# Altium footprint library m-BLANC.PcbLib: 53 footprints (part 3 of 4)
Each footprint in its own frame and in the unit in brackets; x right, y up, seen from the top. Pads: shape width x height; smd on the part's side, far side on the other; paste and mask are expansions set on the pad; w line width, h text height; cw(c..) or ccw(c..) is an arc to the next point about the centre after c.
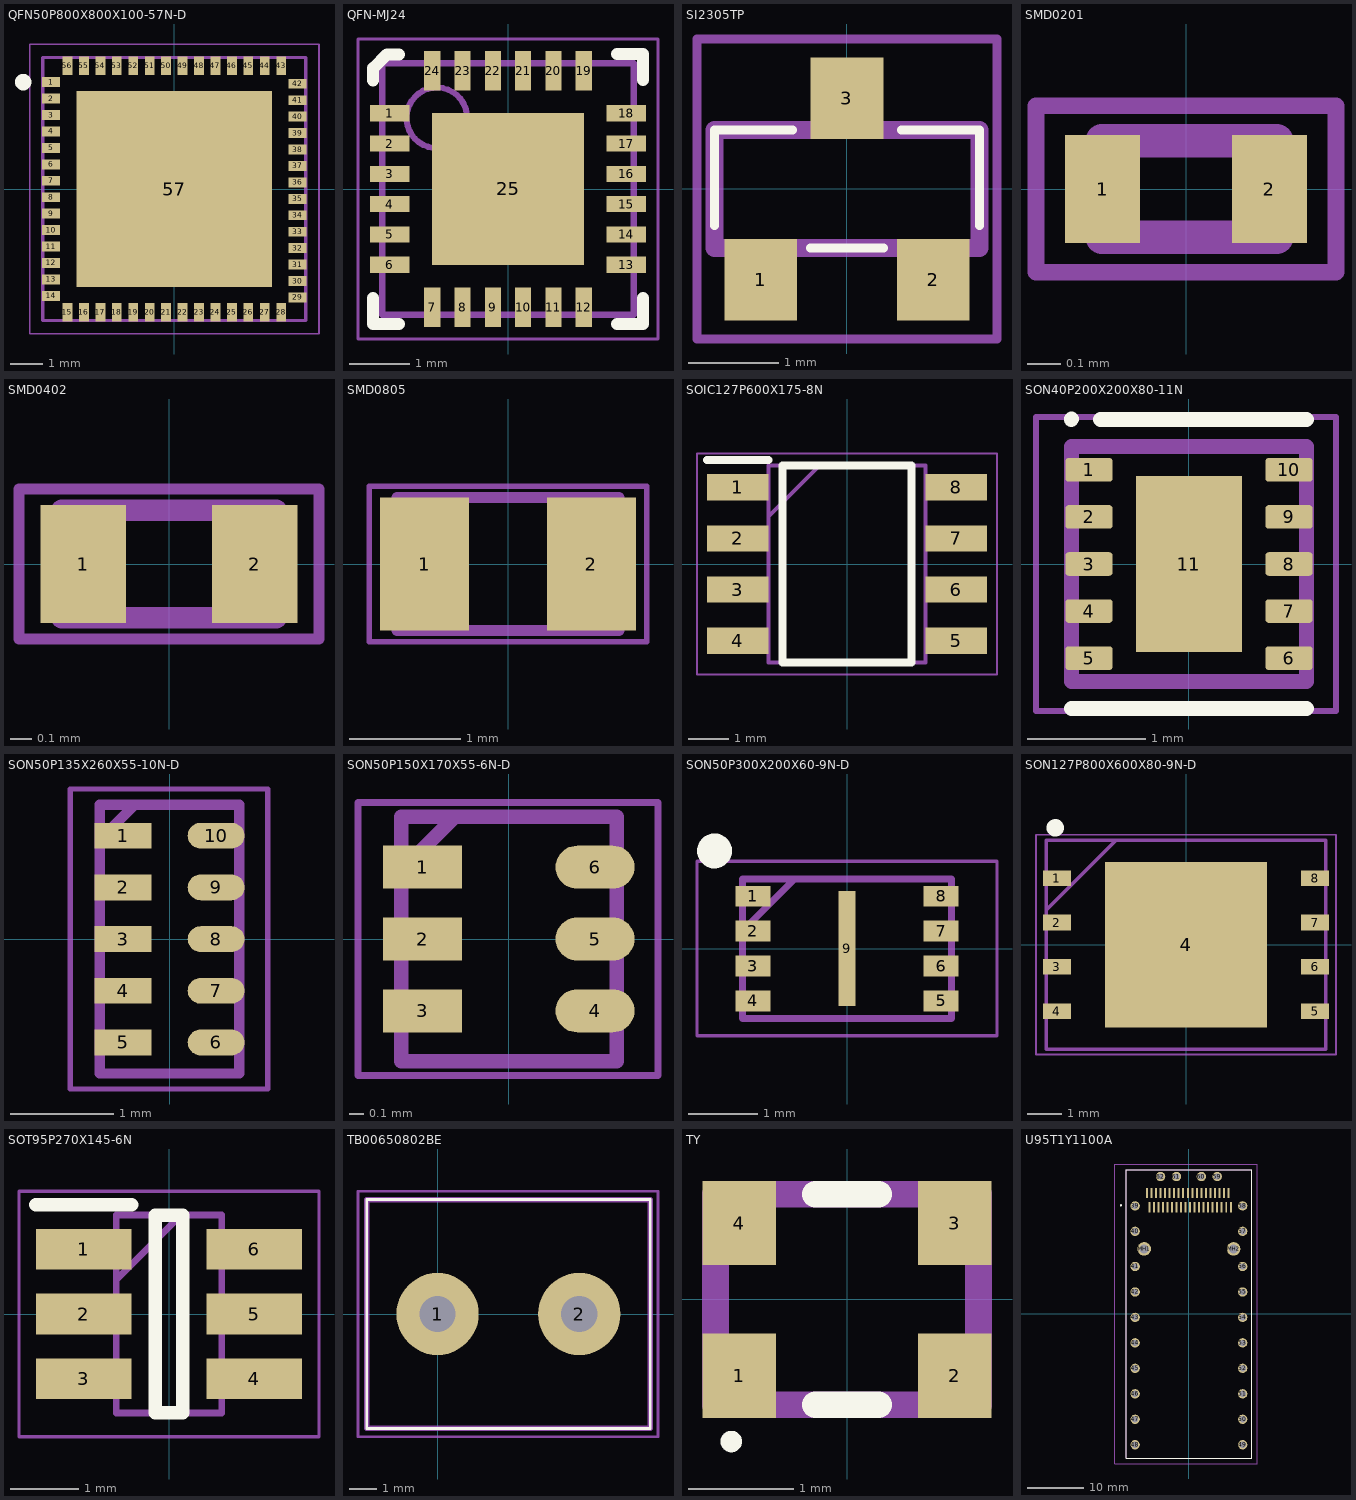
[diagram p2: the footprints below, top view; thin cyan lines are the x and y axes]

## QFN50P800X800X100-57N-D [mm]
pads (57):
  rect 0.55x0.3 smd: 1(-3.75,3.25) 2(-3.75,2.75) 3(-3.75,2.25) 4(-3.75,1.75) 5(-3.75,1.25) 6(-3.75,0.75) 7(-3.75,0.25) 8(-3.75,-0.25) 9(-3.75,-0.75) 10(-3.75,-1.25) 11(-3.75,-1.75) 12(-3.75,-2.25) 13(-3.75,-2.75) 14(-3.75,-3.25) 29(3.75,-3.3) 30(3.75,-2.8) 31(3.75,-2.3) 32(3.75,-1.8) 33(3.75,-1.3) 34(3.75,-0.8) 35(3.75,-0.3) 36(3.75,0.2) 37(3.75,0.7) 38(3.75,1.2) 39(3.75,1.7) 40(3.75,2.2) 41(3.75,2.7) 42(3.75,3.2)
  rect 0.3x0.55 smd: 15(-3.25,-3.75) 16(-2.75,-3.75) 17(-2.25,-3.75) 18(-1.75,-3.75) 19(-1.25,-3.75) 20(-0.75,-3.75) 21(-0.25,-3.75) 22(0.25,-3.75) 23(0.75,-3.75) 24(1.25,-3.75) 25(1.75,-3.75) 26(2.25,-3.75) 27(2.75,-3.75) 28(3.25,-3.75) 43(3.25,3.75) 44(2.75,3.75) 45(2.25,3.75) 46(1.75,3.75) 47(1.25,3.75) 48(0.75,3.75) 49(0.25,3.75) 50(-0.25,3.75) 51(-0.75,3.75) 52(-1.25,3.75) 53(-1.75,3.75) 54(-2.25,3.75) 55(-2.75,3.75) 56(-3.25,3.75)
  rect 5.95x5.95 smd: 57(0,0)
Top Overlay:
  circle w0.25: c-4.6,3.25 r0.125
Mechanical 13:
  lines w0.1: -4,-4 -4,4 4,4 4,-4 -4,-4
Mechanical 15:
  lines w0.05: -4.4,-4.4 -4.4,4.4 4.4,4.4 4.4,-4.4 -4.4,-4.4
3D body: height 0.8, standoff 0, extent -4,-4 4,4

## QFN-MJ24 [mm] "QFN, 24-Leads, Body 4x4mm, Pitch 0.5mm, Microchip Recommended"
height 0.9
pads (25):
  rect 0.65x0.265 smd: 1(-1.95,1.25) 2(-1.95,0.75) 3(-1.95,0.25) 4(-1.95,-0.25) 5(-1.95,-0.75) 6(-1.95,-1.25) 13(1.95,-1.25) 14(1.95,-0.75) 15(1.95,-0.25) 16(1.95,0.25) 17(1.95,0.75) 18(1.95,1.25)
  rect 0.265x0.65 smd: 7(-1.25,-1.95) 8(-0.75,-1.95) 9(-0.25,-1.95) 10(0.25,-1.95) 11(0.75,-1.95) 12(1.25,-1.95) 19(1.25,1.95) 20(0.75,1.95) 21(0.25,1.95) 22(-0.25,1.95) 23(-0.75,1.95) 24(-1.25,1.95)
  rect 2.5x2.5 smd paste-1.3: 25(0,0)
Top Overlay:
  lines w0.2: -2.225,-1.8 -2.225,-2.225 -1.8,-2.225 ; -2.225,1.793 -2.225,1.932 -2.225,1.995 -1.998,2.222 -1.8,2.222 ; 1.8,-2.225 2.225,-2.225 2.225,-1.8 ; 1.8,2.225 2.225,2.225 2.225,1.8
Top Paste:
  rectangle: 0.1,0.1 1.2,1.2
  region: -0.1,1.2 -1.2,1.2 -1.2,0.1 -0.1,0.1
  region: -0.1,-0.1 -1.2,-0.1 -1.2,-1.2 -0.1,-1.2
  rectangle: 0.1,-1.2 1.2,-0.1
Mechanical 13:
  circle w0.1: c-1.175,1.175 r0.5
  lines w0.1: -2.075,-2.075 2.075,-2.075 2.075,2.075 -2.075,2.075 -2.075,-2.075
Mechanical 15:
  lines w0.05: -2.475,-2.475 -2.475,2.475 2.475,2.475 2.475,-2.475 -2.475,-2.475
  lines w0.1: -0.5,0 0.5,0 ; 0,-0.5 0,0.5
3D body: height 0.9, standoff 0, extent -2.074,-2.074 2.074,2.074

## SI2305TP [mm]
pads (3):
  rect 0.8x0.9 smd: 1(-0.95,-1) 2(0.95,-1) 3(0,1)
Top Overlay:
  lines w0.1: -1.46,-0.4 -1.46,0.65 -0.6,0.65 ; -0.4,-0.65 0.4,-0.65 ; 0.6,0.65 1.46,0.65 1.46,-0.4
Mechanical 13:
  lines w0.2: -1.46,-0.65 -1.46,0.65 1.46,0.65 1.46,-0.65 -1.46,-0.65
Mechanical 15:
  lines w0.1: -1.651,-1.651 -1.651,1.651 1.651,1.651 1.651,-1.651 -1.651,-1.651

## SMD0201 [mm]
pads (2):
  rect 0.225x0.325 smd: 1(-0.25,0) 2(0.25,0)
Mechanical 13:
  lines w0.1: -0.252,-0.145 -0.252,0.145 0.272,0.145 0.272,-0.145 -0.252,-0.145
Mechanical 15:
  lines w0.05: -0.45,-0.25 -0.45,0.25 0.45,0.25 0.45,-0.25 -0.45,-0.25
3D body "CPF0201D100RE1.stp": height 0.28, standoff 0, extent -0.29,-0.145 0.29,0.145

## SMD0402 [mm]
pads (2):
  rect 0.4x0.55 smd: 1(-0.4,0) 2(0.4,0)
Mechanical 13:
  lines w0.1: -0.5,-0.25 0.5,-0.25 0.5,0.25 -0.5,0.25 -0.5,-0.25
Mechanical 15:
  lines w0.05: -0.7,-0.35 0.7,-0.35 0.7,0.35 -0.7,0.35 -0.7,-0.35
3D body "BLM15AX601SN1D.stp": height 0.55, standoff 0, extent -0.5,-0.25 0.5,0.25

## SMD0805 [mm]
pads (2):
  rect 0.8x1.2 smd: 1(-0.75,0) 2(0.75,0)
Mechanical 13:
  lines w0.1: -1,-0.6 1,-0.6 1,0.6 -1,0.6 -1,-0.6
Mechanical 15:
  lines w0.05: -1.25,-0.7 1.25,-0.7 1.25,0.7 -1.25,0.7 -1.25,-0.7
3D body "74479775147.stp": height 1, standoff 0, extent -1,-0.6 1,0.6

## SOIC127P600X175-8N [mm]
pads (8):
  rect 1.525x0.65 smd: 1(-2.712,1.905) 2(-2.712,0.635) 3(-2.712,-0.635) 4(-2.712,-1.905) 5(2.712,-1.905) 6(2.712,-0.635) 7(2.712,0.635) 8(2.712,1.905)
Top Overlay:
  lines w0.2: -3.475,2.58 -1.95,2.58 ; -1.6,-2.45 -1.6,2.45 1.6,2.45 1.6,-2.45 -1.6,-2.45
Mechanical 13:
  lines w0.1: -1.95,1.18 -0.68,2.45 ; -1.95,-2.45 -1.95,2.45 1.95,2.45 1.95,-2.45 -1.95,-2.45
Mechanical 15:
  lines w0.05: -3.725,-2.75 -3.725,2.75 3.725,2.75 3.725,-2.75 -3.725,-2.75
3D body "NE555DR.stp": height 1.75, standoff 0, extent -3,-2.45 3,2.45

## SON40P200X200X80-11N [mm]
pads (11):
  rrect25% 0.4x0.2 smd: 1(-0.85,0.8) 2(-0.85,0.4) 3(-0.85,0) 4(-0.85,-0.4) 5(-0.85,-0.8) 6(0.85,-0.8) 7(0.85,-0.4) 8(0.85,0) 9(0.85,0.4) 10(0.85,0.8)
  rect 0.9x1.5 smd paste-2: 11(0,0)
Top Overlay:
  lines w0.127: -1,1.23 -1,1.231 ; -1,-1.23 1,-1.23 ; -0.75,1.23 1,1.23
Mechanical 13:
  lines w0.127: -1,-1 -1,1 1,1 1,-1 -1,-1
Mechanical 15:
  lines w0.05: -1.3,-1.25 1.25,-1.25 1.25,1.25 -1.3,1.25 -1.3,-1.25
3D body "step_temp.STEP": height 0.8, standoff 0, extent -1,-1 1,1

## SON50P135X260X55-10N-D [mm]
pads (10):
  rect 0.55x0.25 smd: 1(-0.45,1) 2(-0.45,0.5) 3(-0.45,0) 4(-0.45,-0.5) 5(-0.45,-1)
  oval 0.55x0.25 smd: 6(0.45,-1) 7(0.45,-0.5) 8(0.45,0) 9(0.45,0.5) 10(0.45,1)
Mechanical 13:
  lines w0.1: -0.675,0.962 -0.338,1.3 ; -0.675,-1.3 -0.675,1.3 0.675,1.3 0.675,-1.3 -0.675,-1.3
Mechanical 15:
  lines w0.05: -0.961,-1.45 -0.961,1.452 0.95,1.452 0.95,-1.45 -0.961,-1.45
3D body "ECMF04-4HSWM10.stp": height 0.55, standoff 0, extent -0.725,-1.3 0.725,1.3

## SON50P150X170X55-6N-D [mm]
pads (6):
  rect 0.55x0.3 smd: 1(-0.6,0.5) 2(-0.6,0) 3(-0.6,-0.5)
  oval 0.55x0.3 smd: 4(0.6,-0.5) 5(0.6,0) 6(0.6,0.5)
Mechanical 13:
  lines w0.1: -0.75,0.475 -0.375,0.85 ; -0.75,-0.85 -0.75,0.85 0.75,0.85 0.75,-0.85 -0.75,-0.85
Mechanical 15:
  lines w0.05: -1.05,-0.95 -1.05,0.95 1.038,0.95 1.038,-0.95 -1.05,-0.95
3D body "ECMF02-2AMX6.stp": height 0.55, standoff 0, extent -0.8,-0.85 0.8,0.85

## SON50P300X200X60-9N-D [mm]
pads (9):
  rect 0.5x0.3 smd: 1(-1.35,0.75) 2(-1.35,0.25) 3(-1.35,-0.25) 4(-1.35,-0.75) 5(1.35,-0.75) 6(1.35,-0.25) 7(1.35,0.25) 8(1.35,0.75)
  rect 0.25x1.65 smd: 9(0,0)
Top Overlay:
  circle w0.25: c-1.9,1.4 r0.125
Mechanical 13:
  lines w0.1: -1.5,0.25 -0.75,1 ; -1.5,-1 -1.5,1 1.5,1 1.5,-1 -1.5,-1
Mechanical 15:
  lines w0.05: -2.15,-1.25 -2.15,1.25 2.15,1.25 2.15,-1.25 -2.15,-1.25
3D body "AT25SF081-MAHD-T.stp": height 0.6, standoff 0, extent -1.55,-1 1.55,1

## SON127P800X600X80-9N-D [mm]
pads (9):
  rect 0.8x0.45 smd: 1(-3.7,1.905) 2(-3.7,0.635) 3(-3.7,-0.635) 4(-3.7,-1.905) 5(3.7,-1.905) 6(3.7,-0.635) 7(3.7,0.635) 8(3.7,1.905)
  rect 4.65x4.75 smd: 4(0,0)
Top Overlay:
  circle w0.25: c-3.75,3.35 r0.125
Mechanical 13:
  lines w0.1: -4,1 -2,3 ; -4,-3 -4,3 4,3 4,-3 -4,-3
Mechanical 15:
  lines w0.05: -4.3,-3.15 -4.3,3.15 4.3,3.15 4.3,-3.15 -4.3,-3.15
3D body "S25HL512TFANHI010.stp": height 0.8, standoff 0, extent -4.05,-3 4.05,3

## SOT95P270X145-6N [mm]
pads (6):
  rect 1.4x0.6 smd: 1(-1.25,0.95) 2(-1.25,0) 3(-1.25,-0.95) 4(1.25,-0.95) 5(1.25,0) 6(1.25,0.95)
Top Overlay:
  lines w0.2: -1.95,1.6 -0.55,1.6 ; -0.2,-1.45 -0.2,1.45 0.2,1.45 0.2,-1.45 -0.2,-1.45
Mechanical 13:
  lines w0.1: -0.775,0.5 0.175,1.45 ; -0.775,-1.45 -0.775,1.45 0.775,1.45 0.775,-1.45 -0.775,-1.45
Mechanical 15:
  lines w0.05: -2.2,-1.8 -2.2,1.8 2.2,1.8 2.2,-1.8 -2.2,-1.8
3D body "93LC46AT-I_OT.stp": height 1.45, standoff 0, extent -1.35,-1.45 1.35,1.45

## TB00650802BE [mm]
pads (2):
  round 2.95 hole 1.3: 1(0,0) 2(5.08,0)
Top Overlay:
  lines w0.1: -2.54,-4.1 7.62,-4.1 7.62,4.1 -2.54,4.1 -2.54,-4.1
Mechanical 13:
  lines w0.2: -2.54,-4.1 7.62,-4.1 7.62,4.1 -2.54,4.1 -2.54,-4.1
Mechanical 15:
  lines w0.1: -2.85,-4.4 7.9,-4.4 7.9,4.4 -2.85,4.4 -2.85,-4.4
3D body "TB006-508-02BE.stp": height 10.5, standoff -5, extent -2.54,-4.1 7.62,4.1

## TY [mm]
pads (4):
  rect 0.7x0.8 smd: 1(-1.025,-0.725) 2(1.025,-0.725) 3(1.025,0.725) 4(-1.025,0.725)
Top Overlay:
  circle w0.1: c-1.1,-1.35 r0.052
  lines w0.254: -0.3,-1 0.3,-1 ; -0.3,1 0.3,1
Mechanical 13:
  lines w0.254: -1.25,-1 -1.25,1 1.25,1 1.25,-1 -1.25,-1
Mechanical 15:
  lines w0.1: -1.25,-1 1.25,-1 1.25,1 -1.25,1 -1.25,-1
3D body: height 0.7, standoff 0, extent -1.249,-0.999 1.249,0.999

## U95T1Y1100A [mm]
pads (64):
  rect 0.35x1.8 smd: 1(-7,18.87) 2(-6.2,18.87) 3(-5.4,18.87) 4(-4.6,18.87) 5(-3.8,18.87) 6(-3,18.87) 7(-2.2,18.87) 8(-1.4,18.87) 9(-0.6,18.87) 10(0.2,18.87) 11(1,18.87) 12(1.8,18.87) 13(2.6,18.87) 14(3.4,18.87) 15(4.2,18.87) 16(5,18.87) 17(5.8,18.87) 18(6.6,18.87) 19(7.4,18.87) 20(7,21.37) 21(6.2,21.37) 22(5.4,21.37) 23(4.6,21.37) 24(3.8,21.37) 25(3,21.37) 26(2.2,21.37) 27(1.4,21.37) 28(0.6,21.37) 29(-0.2,21.37) 30(-1,21.37) 31(-1.8,21.37) 32(-2.6,21.37) 33(-3.4,21.37) 34(-4.2,21.37) 35(-5,21.37) 36(-5.8,21.37) 37(-6.6,21.37) 38(-7.4,21.37)
  round 1.65 hole 1.1: 39(-9.5,19.1) 40(-9.5,14.6) 41(-9.5,8.4) 42(-9.5,3.9) 43(-9.5,-0.6) 44(-9.5,-5.1) 45(-9.5,-9.6) 46(-9.5,-14.1) 47(-9.5,-18.6) 48(-9.5,-23.1) 49(9.5,-23.1) 50(9.5,-18.6) 51(9.5,-14.1) 52(9.5,-9.6) 53(9.5,-5.1) 54(9.5,-0.6) 55(9.5,3.9) 56(9.5,8.4) 57(9.5,14.6) 58(9.5,19.1) 59(5,24.29) 60(2.2,24.29) 61(-2.2,24.29) 62(-5,24.29)
  round 2.4 hole 1.6: MH1(-7.9,11.5) MH2(7.9,11.5)
Top Overlay:
  lines w0.1: -11.075,-25.5 11.075,-25.5 11.075,25.5 -11.075,25.5 -11.075,-25.5
  lines w0.2: -12,19.1 ccw(c-12,19.2) -12,19.3 ccw(c-12,19.2) -12,19.1
Mechanical 13:
  lines w0.2: -11.075,-25.5 11.075,-25.5 11.075,25.5 -11.075,25.5 -11.075,-25.5
Mechanical 15:
  lines w0.1: -13.1,-26.5 12.075,-26.5 12.075,26.5 -13.1,26.5 -13.1,-26.5
3D body "U95-T1Y1-100A.stp": height 15.79, standoff -5, extent -11.075,-25.5 11.075,25.5